# Altium footprint library CONN_HDR_MINI_ST_SMD.PcbLib: 99 footprints (part 4 of 7)
Each footprint in its own frame and in the unit in brackets; x right, y up, seen from the top. Pads: shape width x height; smd on the part's side, far side on the other; paste and mask are expansions set on the pad; w line width, h text height; cw(c..) or ccw(c..) is an arc to the next point about the centre after c.
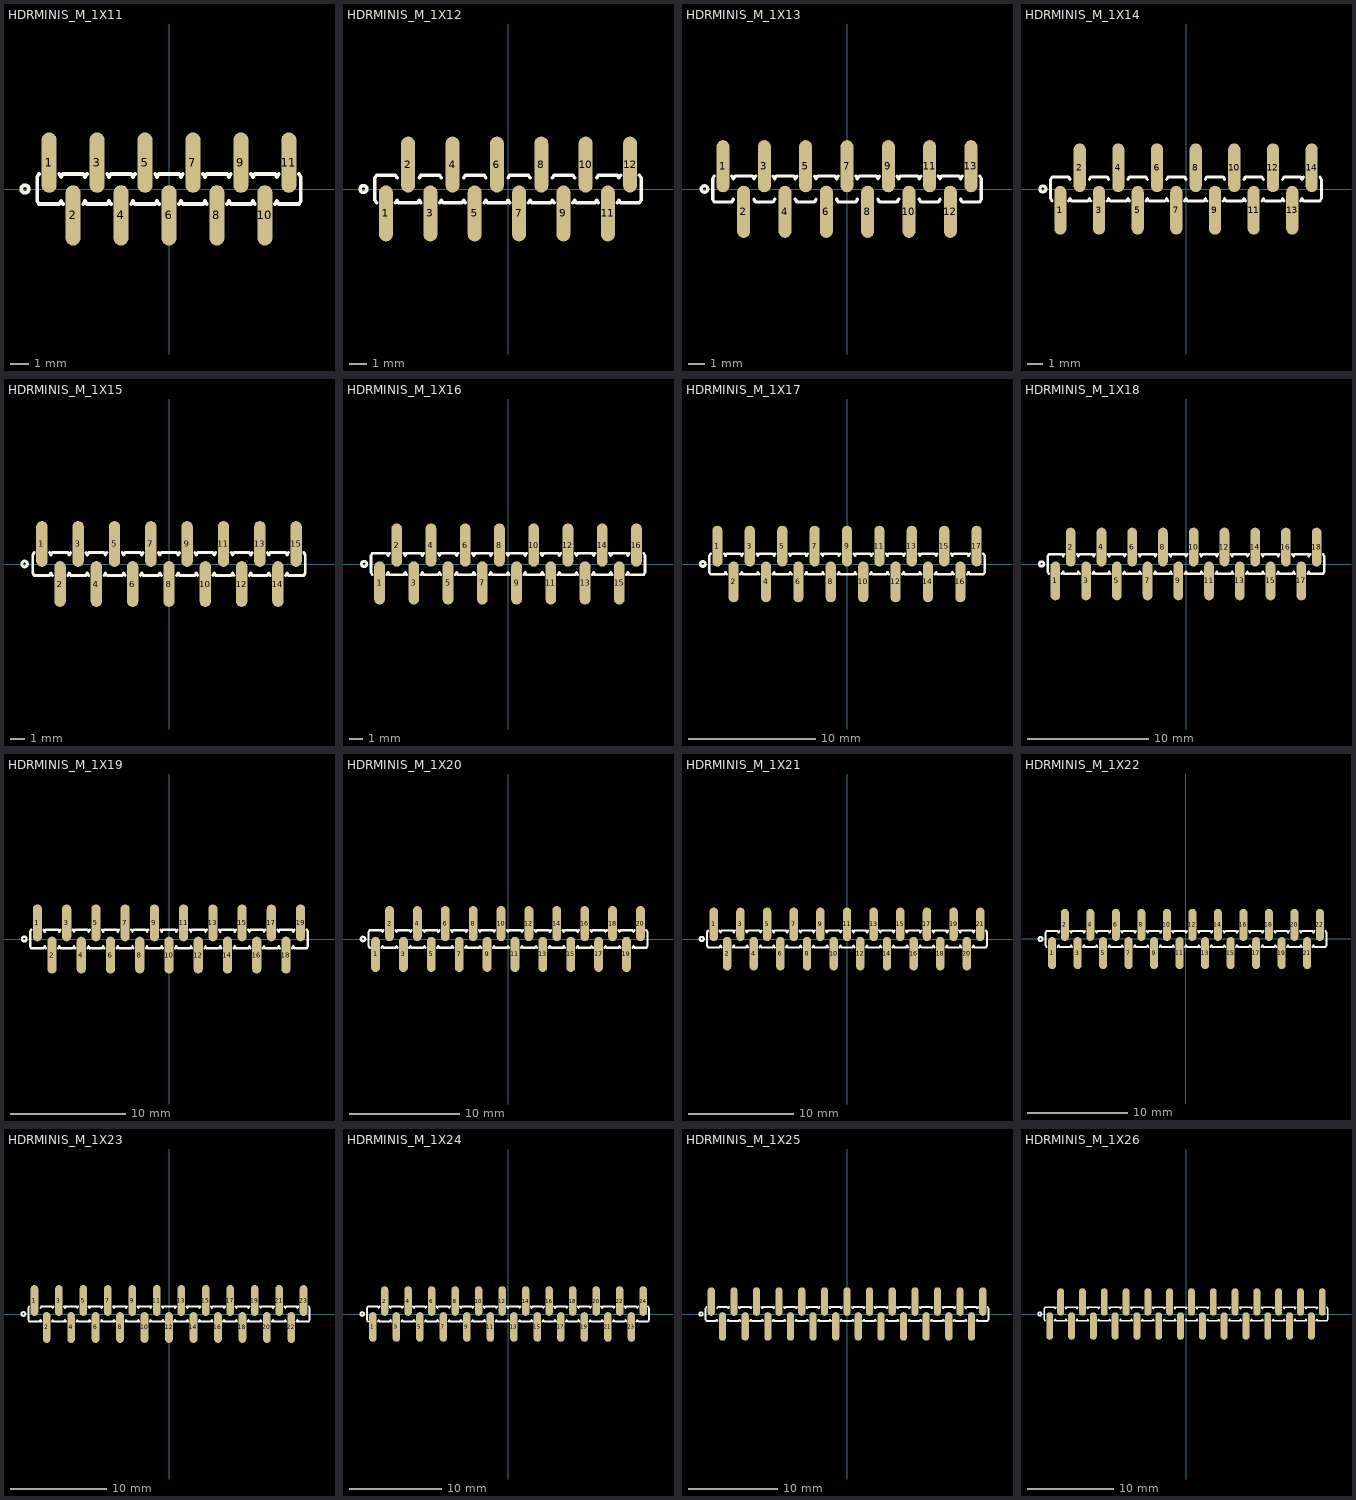
[diagram p3: the footprints below, top view; thin cyan lines are the x and y axes]

## HDRMINIS_M_1X11 [mm] "mini header (50mil pitch)"
pads (11):
  oval 0.8x3.2 smd mask+0.1: 1(-6.35,1.4) 2(-5.08,-1.4) 3(-3.81,1.4) 4(-2.54,-1.4) 5(-1.27,1.4) 6(0,-1.4) 7(1.27,1.4) 8(2.54,-1.4) 9(3.81,1.4) 10(5.08,-1.4) 11(6.35,1.4)
Top Overlay:
  circle w0.2: c-7.635,0 r0.2
  lines w0.2: -6.886,0.8 -6.985,0.635 -6.985,-0.635 -6.886,-0.8 -5.814,-0.8 -5.715,-0.635 -5.616,-0.8 ; -5.814,0.8 -5.715,0.635 -5.616,0.8 -4.544,0.8 -4.445,0.635 -4.346,0.8 ; -4.544,-0.8 -4.445,-0.635 -4.346,-0.8 -3.274,-0.8 -3.175,-0.635 -3.076,-0.8 ; -3.274,0.8 -3.175,0.635 -3.076,0.8 -2.004,0.8 -1.905,0.635 -1.806,0.8 ; -2.004,-0.8 -1.905,-0.635 -1.806,-0.8 -0.734,-0.8 -0.635,-0.635 -0.536,-0.8 ; -0.734,0.8 -0.635,0.635 -0.536,0.8 0.536,0.8 0.635,0.635 0.734,0.8 ; 0.536,-0.8 0.635,-0.635 0.734,-0.8 1.806,-0.8 1.905,-0.635 2.004,-0.8 ; 1.806,0.8 1.905,0.635 2.004,0.8 3.076,0.8 3.175,0.635 3.274,0.8 ; 3.076,-0.8 3.175,-0.635 3.274,-0.8 4.346,-0.8 4.445,-0.635 4.544,-0.8 ; 4.346,0.8 4.445,0.635 4.544,0.8 5.616,0.8 5.715,0.635 5.814,0.8 ; 5.616,-0.8 5.715,-0.635 5.814,-0.8 6.886,-0.8 6.985,-0.635 6.985,0.635 6.886,0.8
3D body "BD021-03A-A1-0350-0200-0550-LB.stp": height 5.5, standoff 0, extent -6.99,-2.75 -3.18,2.75
3D body "BD021-02A-A1-0350-0200-0550-LB.stp": height 5.5, standoff 0, extent -3.175,-2.75 -0.635,2.75
3D body "BD021-02A-A1-0350-0200-0550-LB.stp": height 5.5, standoff 0, extent -0.635,-2.75 1.905,2.75
3D body "BD021-02A-A1-0350-0200-0550-LB.stp": height 5.5, standoff 0, extent 1.905,-2.75 4.445,2.75
3D body "BD021-02A-A1-0350-0200-0550-LB.stp": height 5.5, standoff 0, extent 4.445,-2.75 6.985,2.75

## HDRMINIS_M_1X12 [mm] "mini header (50mil pitch)"
pads (12):
  oval 0.8x3.2 smd mask+0.1: 1(-6.985,-1.4) 2(-5.715,1.4) 3(-4.445,-1.4) 4(-3.175,1.4) 5(-1.905,-1.4) 6(-0.635,1.4) 7(0.635,-1.4) 8(1.905,1.4) 9(3.175,-1.4) 10(4.445,1.4) 11(5.715,-1.4) 12(6.985,1.4)
Top Overlay:
  circle w0.2: c-8.27,0 r0.2
  lines w0.2: -7.521,-0.8 -7.62,-0.635 -7.62,0.635 -7.521,0.8 -6.449,0.8 -6.35,0.635 ; -6.449,-0.8 -6.35,-0.635 -6.251,-0.8 -5.179,-0.8 -5.08,-0.635 -4.981,-0.8 ; -5.08,0.635 -4.981,0.8 -3.909,0.8 -3.81,0.635 ; -3.909,-0.8 -3.81,-0.635 -3.711,-0.8 -2.639,-0.8 -2.54,-0.635 -2.441,-0.8 ; -2.54,0.635 -2.441,0.8 -1.369,0.8 -1.27,0.635 ; -1.369,-0.8 -1.27,-0.635 -1.171,-0.8 -0.099,-0.8 0,-0.635 0.099,-0.8 ; 0,0.635 0.099,0.8 1.171,0.8 1.27,0.635 ; 1.171,-0.8 1.27,-0.635 1.369,-0.8 2.441,-0.8 2.54,-0.635 2.639,-0.8 ; 2.54,0.635 2.639,0.8 3.711,0.8 3.81,0.635 ; 3.711,-0.8 3.81,-0.635 3.909,-0.8 4.981,-0.8 5.08,-0.635 5.179,-0.8 ; 5.08,0.635 5.179,0.8 6.251,0.8 6.35,0.635 6.449,0.8 ; 6.251,-0.8 6.35,-0.635 6.449,-0.8 7.521,-0.8 7.62,-0.635 7.62,0.635 7.521,0.8
3D body "BD021-02A-A1-0350-0200-0550-LB.stp": height 5.5, standoff 0, extent 5.08,-2.75 7.62,2.75
3D body "BD021-02A-A1-0350-0200-0550-LB.stp": height 5.5, standoff 0, extent 2.54,-2.75 5.08,2.75
3D body "BD021-02A-A1-0350-0200-0550-LB.stp": height 5.5, standoff 0, extent 0,-2.75 2.54,2.75
3D body "BD021-02A-A1-0350-0200-0550-LB.stp": height 5.5, standoff 0, extent -2.54,-2.75 0,2.75
3D body "BD021-02A-A1-0350-0200-0550-LB.stp": height 5.5, standoff 0, extent -5.08,-2.75 -2.54,2.75
3D body "BD021-02A-A1-0350-0200-0550-LB.stp": height 5.5, standoff 0, extent -7.62,-2.75 -5.08,2.75

## HDRMINIS_M_1X13 [mm] "mini header (50mil pitch)"
pads (13):
  oval 0.8x3.2 smd mask+0.1: 1(-7.62,1.4) 2(-6.35,-1.4) 3(-5.08,1.4) 4(-3.81,-1.4) 5(-2.54,1.4) 6(-1.27,-1.4) 7(0,1.4) 8(1.27,-1.4) 9(2.54,1.4) 10(3.81,-1.4) 11(5.08,1.4) 12(6.35,-1.4) 13(7.62,1.4)
Top Overlay:
  circle w0.2: c-8.763,0 r0.2
  lines w0.2: -8.156,0.8 -8.255,0.635 -8.255,-0.635 -8.156,-0.8 -7.084,-0.8 -6.985,-0.635 ; -7.084,0.8 -6.985,0.635 -6.886,0.8 -5.814,0.8 -5.715,0.635 -5.616,0.8 ; -5.715,-0.635 -5.616,-0.8 -4.544,-0.8 -4.445,-0.635 ; -4.544,0.8 -4.445,0.635 -4.346,0.8 -3.274,0.8 -3.175,0.635 -3.076,0.8 ; -3.175,-0.635 -3.076,-0.8 -2.004,-0.8 -1.905,-0.635 ; -2.004,0.8 -1.905,0.635 -1.806,0.8 -0.734,0.8 -0.635,0.635 -0.536,0.8 ; -0.635,-0.635 -0.536,-0.8 0.536,-0.8 0.635,-0.635 ; 0.536,0.8 0.635,0.635 0.734,0.8 1.806,0.8 1.905,0.635 2.004,0.8 ; 1.905,-0.635 2.004,-0.8 3.076,-0.8 3.175,-0.635 ; 3.076,0.8 3.175,0.635 3.274,0.8 4.346,0.8 4.445,0.635 4.544,0.8 ; 4.445,-0.635 4.544,-0.8 5.616,-0.8 5.715,-0.635 ; 5.616,0.8 5.715,0.635 5.814,0.8 6.886,0.8 6.985,0.635 7.084,0.8 ; 6.985,-0.635 7.084,-0.8 8.156,-0.8 8.255,-0.635 8.255,0.635 8.156,0.8
3D body "BD021-03A-A1-0350-0200-0550-LB.stp": height 5.5, standoff 0, extent -8.26,-2.75 -4.45,2.75
3D body "BD021-02A-A1-0350-0200-0550-LB.stp": height 5.5, standoff 0, extent -4.445,-2.75 -1.905,2.75
3D body "BD021-02A-A1-0350-0200-0550-LB.stp": height 5.5, standoff 0, extent -1.905,-2.75 0.635,2.75
3D body "BD021-02A-A1-0350-0200-0550-LB.stp": height 5.5, standoff 0, extent 0.635,-2.75 3.175,2.75
3D body "BD021-02A-A1-0350-0200-0550-LB.stp": height 5.5, standoff 0, extent 3.175,-2.75 5.715,2.75
3D body "BD021-02A-A1-0350-0200-0550-LB.stp": height 5.5, standoff 0, extent 5.715,-2.75 8.255,2.75

## HDRMINIS_M_1X14 [mm] "mini header (50mil pitch)"
pads (14):
  oval 0.8x3.2 smd mask+0.1: 1(-8.255,-1.4) 2(-6.985,1.4) 3(-5.715,-1.4) 4(-4.445,1.4) 5(-3.175,-1.4) 6(-1.905,1.4) 7(-0.635,-1.4) 8(0.635,1.4) 9(1.905,-1.4) 10(3.175,1.4) 11(4.445,-1.4) 12(5.715,1.4) 13(6.985,-1.4) 14(8.255,1.4)
Top Overlay:
  circle w0.2: c-9.398,0 r0.2
  lines w0.2: -8.791,-0.8 -8.89,-0.635 -8.89,0.635 -8.791,0.8 -7.719,0.8 -7.62,0.635 ; -7.719,-0.8 -7.62,-0.635 -7.521,-0.8 -6.449,-0.8 -6.35,-0.635 -6.251,-0.8 ; -6.35,0.635 -6.251,0.8 -5.179,0.8 -5.08,0.635 ; -5.179,-0.8 -5.08,-0.635 -4.981,-0.8 -3.909,-0.8 -3.81,-0.635 -3.711,-0.8 ; -3.81,0.635 -3.711,0.8 -2.639,0.8 -2.54,0.635 ; -2.639,-0.8 -2.54,-0.635 -2.441,-0.8 -1.369,-0.8 -1.27,-0.635 -1.171,-0.8 ; -1.27,0.635 -1.171,0.8 -0.099,0.8 0,0.635 ; -0.099,-0.8 0,-0.635 0.099,-0.8 1.171,-0.8 1.27,-0.635 1.369,-0.8 ; 1.27,0.635 1.369,0.8 2.441,0.8 2.54,0.635 ; 2.441,-0.8 2.54,-0.635 2.639,-0.8 3.711,-0.8 3.81,-0.635 3.909,-0.8 ; 3.81,0.635 3.909,0.8 4.981,0.8 5.08,0.635 ; 4.981,-0.8 5.08,-0.635 5.179,-0.8 6.251,-0.8 6.35,-0.635 6.449,-0.8 ; 6.35,0.635 6.449,0.8 7.521,0.8 7.62,0.635 7.719,0.8 ; 7.521,-0.8 7.62,-0.635 7.719,-0.8 8.791,-0.8 8.89,-0.635 8.89,0.635 8.791,0.8
3D body "BD021-02A-A1-0350-0200-0550-LB.stp": height 5.5, standoff 0, extent 6.35,-2.75 8.89,2.75
3D body "BD021-02A-A1-0350-0200-0550-LB.stp": height 5.5, standoff 0, extent 3.81,-2.75 6.35,2.75
3D body "BD021-02A-A1-0350-0200-0550-LB.stp": height 5.5, standoff 0, extent 1.27,-2.75 3.81,2.75
3D body "BD021-02A-A1-0350-0200-0550-LB.stp": height 5.5, standoff 0, extent -1.27,-2.75 1.27,2.75
3D body "BD021-02A-A1-0350-0200-0550-LB.stp": height 5.5, standoff 0, extent -3.81,-2.75 -1.27,2.75
3D body "BD021-02A-A1-0350-0200-0550-LB.stp": height 5.5, standoff 0, extent -6.35,-2.75 -3.81,2.75
3D body "BD021-02A-A1-0350-0200-0550-LB.stp": height 5.5, standoff 0, extent -8.89,-2.75 -6.35,2.75

## HDRMINIS_M_1X15 [mm] "mini header (50mil pitch)"
pads (15):
  oval 0.8x3.2 smd mask+0.1: 1(-8.89,1.4) 2(-7.62,-1.4) 3(-6.35,1.4) 4(-5.08,-1.4) 5(-3.81,1.4) 6(-2.54,-1.4) 7(-1.27,1.4) 8(0,-1.4) 9(1.27,1.4) 10(2.54,-1.4) 11(3.81,1.4) 12(5.08,-1.4) 13(6.35,1.4) 14(7.62,-1.4) 15(8.89,1.4)
Top Overlay:
  circle w0.2: c-10.1,0 r0.2
  lines w0.2: -9.426,0.8 -9.525,0.635 -9.525,-0.635 -9.426,-0.8 -8.354,-0.8 -8.255,-0.635 -8.156,-0.8 ; -8.354,0.8 -8.255,0.635 -8.156,0.8 -7.084,0.8 -6.985,0.635 -6.886,0.8 ; -7.084,-0.8 -6.985,-0.635 -6.886,-0.8 -5.814,-0.8 -5.715,-0.635 -5.616,-0.8 ; -5.814,0.8 -5.715,0.635 -5.616,0.8 -4.544,0.8 -4.445,0.635 -4.346,0.8 ; -4.544,-0.8 -4.445,-0.635 -4.346,-0.8 -3.274,-0.8 -3.175,-0.635 -3.076,-0.8 ; -3.274,0.8 -3.175,0.635 -3.076,0.8 -2.004,0.8 -1.905,0.635 -1.806,0.8 ; -2.004,-0.8 -1.905,-0.635 -1.806,-0.8 -0.734,-0.8 -0.635,-0.635 -0.536,-0.8 ; -0.734,0.8 -0.635,0.635 -0.536,0.8 0.536,0.8 0.635,0.635 0.734,0.8 ; 0.536,-0.8 0.635,-0.635 0.734,-0.8 1.806,-0.8 1.905,-0.635 2.004,-0.8 ; 1.806,0.8 1.905,0.635 2.004,0.8 3.076,0.8 3.175,0.635 3.274,0.8 ; 3.076,-0.8 3.175,-0.635 3.274,-0.8 4.346,-0.8 4.445,-0.635 4.544,-0.8 ; 4.346,0.8 4.445,0.635 4.544,0.8 5.616,0.8 5.715,0.635 5.814,0.8 ; 5.616,-0.8 5.715,-0.635 5.814,-0.8 6.886,-0.8 6.985,-0.635 7.084,-0.8 ; 6.886,0.8 6.985,0.635 7.084,0.8 8.156,0.8 8.255,0.635 8.354,0.8 ; 8.156,-0.8 8.255,-0.635 8.354,-0.8 9.426,-0.8 9.525,-0.635 9.525,0.635 ; 9.525,0.635 9.426,0.8 9.525,0.635
3D body "BD021-02A-A1-0350-0200-0550-LB.stp": height 5.5, standoff 0, extent 6.985,-2.75 9.525,2.75
3D body "BD021-02A-A1-0350-0200-0550-LB.stp": height 5.5, standoff 0, extent 4.445,-2.75 6.985,2.75
3D body "BD021-02A-A1-0350-0200-0550-LB.stp": height 5.5, standoff 0, extent 1.905,-2.75 4.445,2.75
3D body "BD021-02A-A1-0350-0200-0550-LB.stp": height 5.5, standoff 0, extent -0.635,-2.75 1.905,2.75
3D body "BD021-02A-A1-0350-0200-0550-LB.stp": height 5.5, standoff 0, extent -3.175,-2.75 -0.635,2.75
3D body "BD021-02A-A1-0350-0200-0550-LB.stp": height 5.5, standoff 0, extent -5.715,-2.75 -3.175,2.75
3D body "BD021-03A-A1-0350-0200-0550-LB.stp": height 5.5, standoff 0, extent -9.53,-2.75 -5.72,2.75

## HDRMINIS_M_1X16 [mm] "mini header (50mil pitch)"
pads (16):
  oval 0.8x3.2 smd mask+0.1: 1(-9.525,-1.4) 2(-8.255,1.4) 3(-6.985,-1.4) 4(-5.715,1.4) 5(-4.445,-1.4) 6(-3.175,1.4) 7(-1.905,-1.4) 8(-0.635,1.4) 9(0.635,-1.4) 10(1.905,1.4) 11(3.175,-1.4) 12(4.445,1.4) 13(5.715,-1.4) 14(6.985,1.4) 15(8.255,-1.4) 16(9.525,1.4)
Top Overlay:
  circle w0.2: c-10.668,0 r0.2
  lines w0.2: -10.061,-0.8 -10.16,-0.635 -10.16,0.635 -10.061,0.8 -8.989,0.8 -8.89,0.635 -8.791,0.8 ; -8.989,-0.8 -8.89,-0.635 -8.791,-0.8 -7.719,-0.8 -7.62,-0.635 -7.521,-0.8 ; -7.719,0.8 -7.62,0.635 -7.521,0.8 -6.449,0.8 -6.35,0.635 -6.251,0.8 ; -6.449,-0.8 -6.35,-0.635 -6.251,-0.8 -5.179,-0.8 -5.08,-0.635 -4.981,-0.8 ; -5.179,0.8 -5.08,0.635 -4.981,0.8 -3.909,0.8 -3.81,0.635 -3.711,0.8 ; -3.909,-0.8 -3.81,-0.635 -3.711,-0.8 -2.639,-0.8 -2.54,-0.635 -2.441,-0.8 ; -2.639,0.8 -2.54,0.635 -2.441,0.8 -1.369,0.8 -1.27,0.635 -1.171,0.8 ; -1.369,-0.8 -1.27,-0.635 -1.171,-0.8 -0.099,-0.8 0,-0.635 0.099,-0.8 ; -0.099,0.8 0,0.635 0.099,0.8 1.171,0.8 1.27,0.635 1.369,0.8 ; 1.171,-0.8 1.27,-0.635 1.369,-0.8 2.441,-0.8 2.54,-0.635 2.639,-0.8 ; 2.441,0.8 2.54,0.635 2.639,0.8 3.711,0.8 3.81,0.635 3.909,0.8 ; 3.711,-0.8 3.81,-0.635 3.909,-0.8 4.981,-0.8 5.08,-0.635 5.179,-0.8 ; 4.981,0.8 5.08,0.635 5.179,0.8 6.251,0.8 6.35,0.635 6.449,0.8 ; 6.251,-0.8 6.35,-0.635 6.449,-0.8 7.521,-0.8 7.62,-0.635 7.719,-0.8 ; 7.521,0.8 7.62,0.635 7.719,0.8 8.791,0.8 8.89,0.635 8.989,0.8 ; 8.791,-0.8 8.89,-0.635 8.989,-0.8 10.061,-0.8 10.16,-0.635 10.16,0.635 10.061,0.8
3D body "BD021-02A-A1-0350-0200-0550-LB.stp": height 5.5, standoff 0, extent 7.62,-2.75 10.16,2.75
3D body "BD021-02A-A1-0350-0200-0550-LB.stp": height 5.5, standoff 0, extent 5.08,-2.75 7.62,2.75
3D body "BD021-02A-A1-0350-0200-0550-LB.stp": height 5.5, standoff 0, extent 2.54,-2.75 5.08,2.75
3D body "BD021-02A-A1-0350-0200-0550-LB.stp": height 5.5, standoff 0, extent 0,-2.75 2.54,2.75
3D body "BD021-02A-A1-0350-0200-0550-LB.stp": height 5.5, standoff 0, extent -2.54,-2.75 0,2.75
3D body "BD021-02A-A1-0350-0200-0550-LB.stp": height 5.5, standoff 0, extent -5.08,-2.75 -2.54,2.75
3D body "BD021-02A-A1-0350-0200-0550-LB.stp": height 5.5, standoff 0, extent -7.62,-2.75 -5.08,2.75
3D body "BD021-02A-A1-0350-0200-0550-LB.stp": height 5.5, standoff 0, extent -10.16,-2.75 -7.62,2.75

## HDRMINIS_M_1X17 [mm] "mini header (50mil pitch)"
pads (17):
  oval 0.8x3.2 smd mask+0.1: 1(-10.16,1.4) 2(-8.89,-1.4) 3(-7.62,1.4) 4(-6.35,-1.4) 5(-5.08,1.4) 6(-3.81,-1.4) 7(-2.54,1.4) 8(-1.27,-1.4) 9(0,1.4) 10(1.27,-1.4) 11(2.54,1.4) 12(3.81,-1.4) 13(5.08,1.4) 14(6.35,-1.4) 15(7.62,1.4) 16(8.89,-1.4) 17(10.16,1.4)
Top Overlay:
  circle w0.2: c-11.303,0 r0.2
  lines w0.2: -10.696,0.8 -10.795,0.635 -10.795,-0.635 -10.696,-0.8 -9.624,-0.8 -9.525,-0.635 -9.426,-0.8 ; -9.624,0.8 -9.525,0.635 -9.426,0.8 -8.354,0.8 -8.255,0.635 -8.156,0.8 ; -8.354,-0.8 -8.255,-0.635 -8.156,-0.8 -7.084,-0.8 -6.985,-0.635 -6.886,-0.8 ; -7.084,0.8 -6.985,0.635 -6.886,0.8 -5.814,0.8 -5.715,0.635 -5.616,0.8 ; -5.814,-0.8 -5.715,-0.635 -5.616,-0.8 -4.544,-0.8 -4.445,-0.635 -4.346,-0.8 ; -4.544,0.8 -4.445,0.635 -4.346,0.8 -3.274,0.8 -3.175,0.635 -3.076,0.8 ; -3.274,-0.8 -3.175,-0.635 -3.076,-0.8 -2.004,-0.8 -1.905,-0.635 -1.806,-0.8 ; -2.004,0.8 -1.905,0.635 -1.806,0.8 -0.734,0.8 -0.635,0.635 -0.536,0.8 ; -0.734,-0.8 -0.635,-0.635 -0.536,-0.8 0.536,-0.8 0.635,-0.635 0.734,-0.8 ; 0.536,0.8 0.635,0.635 0.734,0.8 1.806,0.8 1.905,0.635 2.004,0.8 ; 1.806,-0.8 1.905,-0.635 2.004,-0.8 3.076,-0.8 3.175,-0.635 3.274,-0.8 ; 3.076,0.8 3.175,0.635 3.274,0.8 4.346,0.8 4.445,0.635 4.544,0.8 ; 4.346,-0.8 4.445,-0.635 4.544,-0.8 5.616,-0.8 5.715,-0.635 5.814,-0.8 ; 5.616,0.8 5.715,0.635 5.814,0.8 6.886,0.8 6.985,0.635 7.084,0.8 ; 6.886,-0.8 6.985,-0.635 7.084,-0.8 8.156,-0.8 8.255,-0.635 8.354,-0.8 ; 8.156,0.8 8.255,0.635 8.354,0.8 9.426,0.8 9.525,0.635 9.624,0.8 ; 9.426,-0.8 9.525,-0.635 9.624,-0.8 10.696,-0.8 10.795,-0.635 10.795,0.635 10.696,0.8
3D body "BD021-03A-A1-0350-0200-0550-LB.stp": height 5.5, standoff 0, extent -10.8,-2.75 -6.99,2.75
3D body "BD021-02A-A1-0350-0200-0550-LB.stp": height 5.5, standoff 0, extent -6.985,-2.75 -4.445,2.75
3D body "BD021-02A-A1-0350-0200-0550-LB.stp": height 5.5, standoff 0, extent -4.445,-2.75 -1.905,2.75
3D body "BD021-02A-A1-0350-0200-0550-LB.stp": height 5.5, standoff 0, extent -1.905,-2.75 0.635,2.75
3D body "BD021-02A-A1-0350-0200-0550-LB.stp": height 5.5, standoff 0, extent 0.635,-2.75 3.175,2.75
3D body "BD021-02A-A1-0350-0200-0550-LB.stp": height 5.5, standoff 0, extent 3.175,-2.75 5.715,2.75
3D body "BD021-02A-A1-0350-0200-0550-LB.stp": height 5.5, standoff 0, extent 5.715,-2.75 8.255,2.75
3D body "BD021-02A-A1-0350-0200-0550-LB.stp": height 5.5, standoff 0, extent 8.255,-2.75 10.795,2.75

## HDRMINIS_M_1X18 [mm] "mini header (50mil pitch)"
pads (18):
  oval 0.8x3.2 smd mask+0.1: 1(-10.795,-1.4) 2(-9.525,1.4) 3(-8.255,-1.4) 4(-6.985,1.4) 5(-5.715,-1.4) 6(-4.445,1.4) 7(-3.175,-1.4) 8(-1.905,1.4) 9(-0.635,-1.4) 10(0.635,1.4) 11(1.905,-1.4) 12(3.175,1.4) 13(4.445,-1.4) 14(5.715,1.4) 15(6.985,-1.4) 16(8.255,1.4) 17(9.525,-1.4) 18(10.795,1.4)
Top Overlay:
  circle w0.2: c-11.938,0 r0.2
  lines w0.2: -11.331,-0.8 -11.43,-0.635 -11.43,0.635 -11.331,0.8 -10.259,0.8 -10.16,0.635 -10.061,0.8 ; -10.259,-0.8 -10.16,-0.635 -10.061,-0.8 -8.989,-0.8 -8.89,-0.635 -8.791,-0.8 ; -8.989,0.8 -8.89,0.635 -8.791,0.8 -7.719,0.8 -7.62,0.635 -7.521,0.8 ; -7.719,-0.8 -7.62,-0.635 -7.521,-0.8 -6.449,-0.8 -6.35,-0.635 -6.251,-0.8 ; -6.449,0.8 -6.35,0.635 -6.251,0.8 -5.179,0.8 -5.08,0.635 -4.981,0.8 ; -5.179,-0.8 -5.08,-0.635 -4.981,-0.8 -3.909,-0.8 -3.81,-0.635 -3.711,-0.8 ; -3.909,0.8 -3.81,0.635 -3.711,0.8 -2.639,0.8 -2.54,0.635 -2.441,0.8 ; -2.639,-0.8 -2.54,-0.635 -2.441,-0.8 -1.369,-0.8 -1.27,-0.635 -1.171,-0.8 ; -1.369,0.8 -1.27,0.635 -1.171,0.8 -0.099,0.8 0,0.635 0.099,0.8 ; -0.099,-0.8 0,-0.635 0.099,-0.8 1.171,-0.8 1.27,-0.635 1.369,-0.8 ; 1.171,0.8 1.27,0.635 1.369,0.8 2.441,0.8 2.54,0.635 2.639,0.8 ; 2.441,-0.8 2.54,-0.635 2.639,-0.8 3.711,-0.8 3.81,-0.635 3.909,-0.8 ; 3.711,0.8 3.81,0.635 3.909,0.8 4.981,0.8 5.08,0.635 5.179,0.8 ; 4.981,-0.8 5.08,-0.635 5.179,-0.8 6.251,-0.8 6.35,-0.635 6.449,-0.8 ; 6.251,0.8 6.35,0.635 6.449,0.8 7.521,0.8 7.62,0.635 7.719,0.8 ; 7.521,-0.8 7.62,-0.635 7.719,-0.8 8.791,-0.8 8.89,-0.635 8.989,-0.8 ; 8.791,0.8 8.89,0.635 8.989,0.8 10.061,0.8 10.16,0.635 10.259,0.8 ; 10.061,-0.8 10.16,-0.635 10.259,-0.8 11.331,-0.8 11.43,-0.635 11.43,0.635 11.331,0.8
3D body "BD021-02A-A1-0350-0200-0550-LB.stp": height 5.5, standoff 0, extent -11.43,-2.75 -8.89,2.75
3D body "BD021-02A-A1-0350-0200-0550-LB.stp": height 5.5, standoff 0, extent -8.89,-2.75 -6.35,2.75
3D body "BD021-02A-A1-0350-0200-0550-LB.stp": height 5.5, standoff 0, extent -6.35,-2.75 -3.81,2.75
3D body "BD021-02A-A1-0350-0200-0550-LB.stp": height 5.5, standoff 0, extent -3.81,-2.75 -1.27,2.75
3D body "BD021-02A-A1-0350-0200-0550-LB.stp": height 5.5, standoff 0, extent -1.27,-2.75 1.27,2.75
3D body "BD021-02A-A1-0350-0200-0550-LB.stp": height 5.5, standoff 0, extent 1.27,-2.75 3.81,2.75
3D body "BD021-02A-A1-0350-0200-0550-LB.stp": height 5.5, standoff 0, extent 3.81,-2.75 6.35,2.75
3D body "BD021-02A-A1-0350-0200-0550-LB.stp": height 5.5, standoff 0, extent 6.35,-2.75 8.89,2.75
3D body "BD021-02A-A1-0350-0200-0550-LB.stp": height 5.5, standoff 0, extent 8.89,-2.75 11.43,2.75

## HDRMINIS_M_1X19 [mm] "mini header (50mil pitch)"
pads (19):
  oval 0.8x3.2 smd mask+0.1: 1(-11.43,1.4) 2(-10.16,-1.4) 3(-8.89,1.4) 4(-7.62,-1.4) 5(-6.35,1.4) 6(-5.08,-1.4) 7(-3.81,1.4) 8(-2.54,-1.4) 9(-1.27,1.4) 10(0,-1.4) 11(1.27,1.4) 12(2.54,-1.4) 13(3.81,1.4) 14(5.08,-1.4) 15(6.35,1.4) 16(7.62,-1.4) 17(8.89,1.4) 18(10.16,-1.4) 19(11.43,1.4)
Top Overlay:
  circle w0.2: c-12.573,0 r0.2
  lines w0.2: -11.966,0.8 -12.065,0.635 -12.065,-0.635 -11.966,-0.8 -10.894,-0.8 -10.795,-0.635 -10.696,-0.8 ; -10.894,0.8 -10.795,0.635 -10.696,0.8 -9.624,0.8 -9.525,0.635 -9.426,0.8 ; -9.624,-0.8 -9.525,-0.635 -9.426,-0.8 -8.354,-0.8 -8.255,-0.635 -8.156,-0.8 ; -8.354,0.8 -8.255,0.635 -8.156,0.8 -7.084,0.8 -6.985,0.635 -6.886,0.8 ; -7.084,-0.8 -6.985,-0.635 -6.886,-0.8 -5.814,-0.8 -5.715,-0.635 -5.616,-0.8 ; -5.814,0.8 -5.715,0.635 -5.616,0.8 -4.544,0.8 -4.445,0.635 -4.346,0.8 ; -4.544,-0.8 -4.445,-0.635 -4.346,-0.8 -3.274,-0.8 -3.175,-0.635 -3.076,-0.8 ; -3.274,0.8 -3.175,0.635 -3.076,0.8 -2.004,0.8 -1.905,0.635 -1.806,0.8 ; -2.004,-0.8 -1.905,-0.635 -1.806,-0.8 -0.734,-0.8 -0.635,-0.635 -0.536,-0.8 ; -0.734,0.8 -0.635,0.635 -0.536,0.8 0.536,0.8 0.635,0.635 0.734,0.8 ; 0.536,-0.8 0.635,-0.635 0.734,-0.8 1.806,-0.8 1.905,-0.635 2.004,-0.8 ; 1.806,0.8 1.905,0.635 2.004,0.8 3.076,0.8 3.175,0.635 3.274,0.8 ; 3.076,-0.8 3.175,-0.635 3.274,-0.8 4.346,-0.8 4.445,-0.635 4.544,-0.8 ; 4.346,0.8 4.445,0.635 4.544,0.8 5.616,0.8 5.715,0.635 5.814,0.8 ; 5.616,-0.8 5.715,-0.635 5.814,-0.8 6.886,-0.8 6.985,-0.635 7.084,-0.8 ; 6.886,0.8 6.985,0.635 7.084,0.8 8.156,0.8 8.255,0.635 8.354,0.8 ; 8.156,-0.8 8.255,-0.635 8.354,-0.8 9.426,-0.8 9.525,-0.635 9.624,-0.8 ; 9.426,0.8 9.525,0.635 9.624,0.8 10.696,0.8 10.795,0.635 10.894,0.8 ; 10.696,-0.8 10.795,-0.635 10.894,-0.8 11.966,-0.8 12.065,-0.635 12.065,0.635 11.966,0.8
3D body "BD021-02A-A1-0350-0200-0550-LB.stp": height 5.5, standoff 0, extent 9.525,-2.75 12.065,2.75
3D body "BD021-02A-A1-0350-0200-0550-LB.stp": height 5.5, standoff 0, extent 6.985,-2.75 9.525,2.75
3D body "BD021-02A-A1-0350-0200-0550-LB.stp": height 5.5, standoff 0, extent 4.445,-2.75 6.985,2.75
3D body "BD021-02A-A1-0350-0200-0550-LB.stp": height 5.5, standoff 0, extent 1.905,-2.75 4.445,2.75
3D body "BD021-02A-A1-0350-0200-0550-LB.stp": height 5.5, standoff 0, extent -0.635,-2.75 1.905,2.75
3D body "BD021-02A-A1-0350-0200-0550-LB.stp": height 5.5, standoff 0, extent -3.175,-2.75 -0.635,2.75
3D body "BD021-02A-A1-0350-0200-0550-LB.stp": height 5.5, standoff 0, extent -5.715,-2.75 -3.175,2.75
3D body "BD021-02A-A1-0350-0200-0550-LB.stp": height 5.5, standoff 0, extent -8.255,-2.75 -5.715,2.75